# Altium footprint library Cty1.PcbLib: 869 footprints (part 35 of 55)
Each footprint in its own frame and in the unit in brackets; x right, y up, seen from the top. Pads: shape width x height; smd on the part's side, far side on the other; paste and mask are expansions set on the pad; w line width, h text height; cw(c..) or ccw(c..) is an arc to the next point about the centre after c.
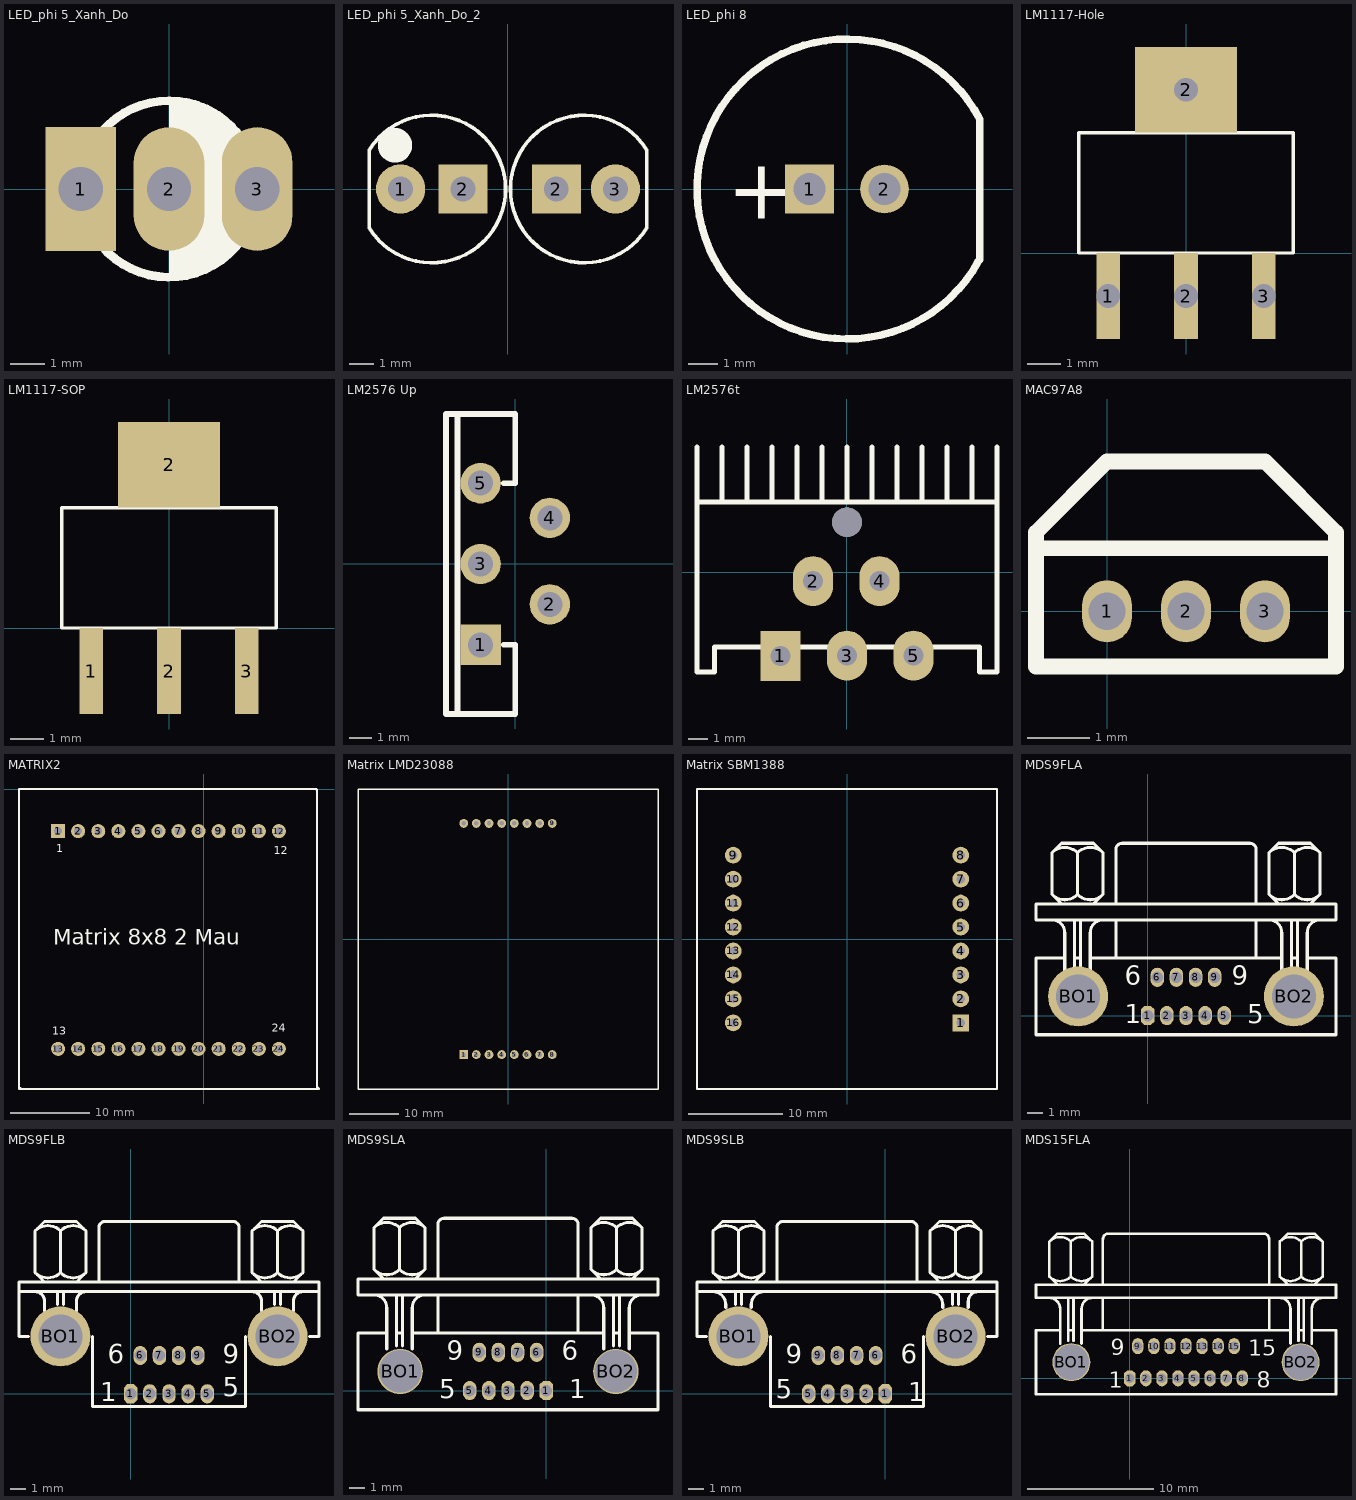
[diagram p34: the footprints below, top view; thin cyan lines are the x and y axes]

## LED_phi 5_Xanh_Do [mil] "LED phi 5mm 2 mau xanh va do"
height 314.96
pads (3):
  rect 80x140 hole 50: 1(-100,0)
  oval 80x140 hole 50: 2(0,0) 3(100,0)
Top Overlay:
  region: 0,100 0,-100 25,-100 35,-90 50,-90 87.62,-52.38 87.62,45.71 88.49,46.58 88.49,51.51 70.71,69.29 70.71,70.71 69.29,70.71 47,93 7,93
  region: 0,100 7,93 27,93
  lines w10: 0,100 cw(c0,0) 70.71,70.71 ; 87.62,-48.19 cw(c0,0) 88.49,46.58 88.49,-47.32

## LED_phi 5_Xanh_Do_2 [mm] "LED phi 5mm 2 mau xanh va do doc lap"
height 8
pads (4):
  round 2 hole 1: 1(-4.37,0) 3(4.37,0)
  rect 2x2 hole 1: 2(-1.83,0) 2(1.97,0)
Top Overlay:
  circle w1: c-4.594,1.778 r0.2
  lines w0.15: -5.64,-1.6 -5.64,1.575 ; -5.638,-1.599 ccw(c-3.1,0) -5.638,1.599 ; 5.638,-1.575 5.638,1.6 ; 5.638,-1.599 cw(c3.1,0) 5.638,1.599

## LED_phi 8 [mil] "LED phi 8mm"
height 649.61
pads (2):
  rect 65x65 hole 43.31: 1(-50,0)
  round 65 hole 43.31: 2(50,0)
Top Overlay:
  lines w10: 175.24,-96.38 cw(c0,0) 176.98,93.15 176.98,-94.64
  text "+" at -160,-40 h80

## LM1117-Hole [mm]
pads (4):
  rect 0.7x2.54 hole 0.7: 1(-2.3,-1.27) 2(0,-1.27) 3(2.3,-1.27)
  rect 3x2.54 hole 0.7: 2(0,4.826)
Top Overlay:
  lines w0.1: -3.175,0 -3.175,3.556 3.175,3.556 3.175,0 -3.175,0
3D body "SW3DPS-SOT-223-DEFAULT.step": height 1.68, standoff 0, extent -3.25,-1.702 3.25,5.258

## LM1117-SOP [mm]
pads (4):
  rect 0.7x2.54 smd: 1(-2.3,-1.27) 2(0,-1.27) 3(2.3,-1.27)
  rect 3x2.54 smd: 2(0,4.826)
Top Overlay:
  lines w0.1: -3.175,0 -3.175,3.556 3.175,3.556 3.175,0 -3.175,0
3D body "SW3DPS-SOT-223-DEFAULT.step": height 1.68, standoff 0, extent -3.25,-1.778 3.25,5.182

## LM2576 Up [mil] "IC nguon LM2576"
pads (5):
  rect 70x70 hole 43.31: 1(-60,-140)
  round 70 hole 43.31: 2(60,-70) 3(-60,0) 4(60,80) 5(-60,140)
Top Overlay:
  lines w10: -100,-260 -100,260 ; -20,-140 0,-140 0,-260 -120,-260 -120,260 0,260 0,140 -20,140

## LM2576t [mil]
pads (6):
  rect 80x100 hole 40: 1(-132,-167.09)
  oval 80x100 hole 40: 2(-67,-18) 3(1,-167) 4(66,-18) 5(134,-167)
  round 59.06 hole 59.06: ""(1,100)
Top Overlay:
  lines w10: -299,140 301,140 ; -299,250 -299,-200 -264,-200 -264,-150 266,-150 266,-200 301,-200 301,250 ; -249,140 -249,250 ; -199,140 -199,250 ; -149,140 -149,250 ; -99,140 -99,250 ; -49,140 -49,250 ; 1,140 1,250 ; 51,140 51,250 ; 101,140 101,250 ; 151,140 151,250 ; 201,140 201,250 ; 251,140 251,250
3D body "SW3dPS-TO220-5.STEP": height 859.05, standoff -85.43, extent -199,-174.91 201,149.5

## MAC97A8 [mm]
pads (3):
  oval 0.8x1 hole 0.6: 1(0,0) 2(1.27,0) 3(2.54,0)
Top Overlay:
  lines w0.254: -1.143,1.016 -1.143,-0.889 3.683,-0.889 3.683,1.016 ; -1.143,1.016 -1.143,1.27 0,2.413 2.54,2.413 3.683,1.27 3.683,1.016 ; -1.143,1.016 3.683,1.016

## MATRIX2 [mil]
pads (24):
  rect 70x70 hole 39.37: 1(-725,-210)
  round 70 hole 39.37: 2(-625,-210) 3(-525,-210) 4(-425,-210) 5(-325,-210) 6(-225,-210) 7(-125,-210) 8(-25,-210) 9(75,-210) 10(175,-210) 11(275,-210) 12(375,-210) 13(-725,-1295) 14(-625,-1295) 15(-525,-1295) 16(-425,-1295) 17(-325,-1295) 18(-225,-1295) 19(-125,-1295) 20(-25,-1295) 21(75,-1295) 22(175,-1295) 23(275,-1295) 24(375,-1295)
Top Overlay:
  lines w10: 555,0 -920,0 -920,-1495 -915,-1490 -910,-1495 575,-1495 565,-1485 565,-5 560,0
  text "Matrix 8x8 2 Mau" at -750,-775 h78.74
  text "1" at -735,-315 h39.37
  text "12" at 350,-325 h39.37
  text "13" at -755,-1225 h39.37
  text "24" at 340,-1210 h39.37

## Matrix LMD23088 [mil] "Matrix 8x8"
pads (16):
  rect 70x70 hole 35: 1(-350,-913.39)
  round 70 hole 35: 2(-250,-913.39) 3(-150,-913.39) 4(-50,-913.39) 5(50,-913.39) 6(150,-913.39) 7(250,-913.39) 8(350,-913.39) 9(350,913.39) 10(250,913.39) 11(150,913.39) 12(50,913.39) 13(-50,913.39) 14(-150,913.39) 15(-250,913.39) 16(-350,913.39)
Top Overlay:
  lines w10: -1185.04,-1185.04 1185.04,-1185.04 1185.04,1185.04 -1185.04,1185.04 -1185.04,-1185.04

## Matrix SBM1388 [mil] "Matrix 8x8"
pads (16):
  rect 70x70 hole 35: 1(475,-350)
  round 70 hole 35: 2(475,-250) 3(475,-150) 4(475,-50) 5(475,50) 6(475,150) 7(475,250) 8(475,350) 9(-475,350) 10(-475,250) 11(-475,150) 12(-475,50) 13(-475,-50) 14(-475,-150) 15(-475,-250) 16(-475,-350)
Top Overlay:
  lines w10: -625.98,-625.98 625.98,-625.98 625.98,625.98 -625.98,625.98 -625.98,-625.98

## MDS9FLA [mil]
pads (11):
  oct 35x50 hole 30: 1(0,0)
  oval 35x50 hole 30: 2(50,0) 3(100,0) 4(150,0) 5(200,0) 6(25,100) 7(75,100) 8(125,100) 9(175,100)
  round 156.67 hole 115: BO1(-181.67,50) BO2(381.67,50)
Top Overlay:
  lines w8: -250.25,316.41 ccw(c-216.67,350) -183.08,316.41 ; -250.25,425.25 cw(c-216.67,391.67) -183.08,425.25 ; -250,250 cw(c-250,216.67) -216.67,216.67 -216.67,108.33 ; -225,291.67 -250,316.67 -250,425 -225,450 -141.67,450 -116.67,425 -116.67,316.67 -141.67,291.67 ; -216.67,150 -291.67,150 -291.67,-50 491.67,-50 491.67,150 416.67,150 ; -191.67,116.67 -191.67,250 ; -191.67,150 -175,150 ; -183.59,316.41 ccw(c-150,350) -116.41,316.41 ; -183.59,425.25 cw(c-150,391.67) -116.41,425.25 ; -183.33,316.67 -183.33,425 ; -175,116.67 -175,250 ; -150,108.33 -150,216.67 cw(c-116.67,216.67) -116.67,250 ; -150,150 350,150 ; -83.33,150 -83.33,250 ; -83.33,291.67 -83.33,433.33 cw(c-66.67,433.33) -66.67,450 266.67,450 cw(c266.67,433.33) 283.33,433.33 283.33,291.67 275,291.67 ; 283.33,150 283.33,250 ; 316.41,316.41 ccw(c350,350) 383.59,316.41 ; 316.41,425.25 cw(c350,391.67) 383.59,425.25 ; 316.67,250 cw(c316.67,216.67) 350,216.67 350,108.33 ; 341.67,291.67 316.67,316.67 316.67,425 341.67,450 425,450 450,425 450,316.67 425,291.67 ; 375,116.67 375,250 ; 375,150 391.67,150 ; 383.08,316.41 ccw(c416.67,350) 450.25,316.41 ; 383.08,425.25 cw(c416.67,391.67) 450.25,425.25 ; 383.33,316.67 383.33,425 ; 391.67,116.67 391.67,250 ; 416.67,108.33 416.67,216.67 cw(c450,216.67) 450,250 ; -291.67,250 491.67,250 491.67,291.67 -291.67,291.67 -291.67,250
  text "1" at -60,-20 h50
  text "9" at 220,80 h50
  text "5" at 260,-20 h50
  text "6" at -60,80 h50

## MDS9FLB [mil]
pads (11):
  oct 35x50 hole 30: 1(0,0)
  oval 35x50 hole 30: 2(50,0) 3(100,0) 4(150,0) 5(200,0) 6(25,100) 7(75,100) 8(125,100) 9(175,100)
  round 156.67 hole 115: BO1(-183.33,150) BO2(383.33,150)
Top Overlay:
  lines w8: -266.67,150 -291.67,150 -291.67,266.67 ; -250.25,316.41 ccw(c-216.67,350) -183.08,316.41 ; -250.25,425.25 cw(c-216.67,391.67) -183.08,425.25 ; -250,266.67 cw(c-250,241.67) -225,241.67 -225,216.67 ; -225,291.67 -250,316.67 -250,425 -225,450 -141.67,450 -116.67,425 -116.67,316.67 -141.67,291.67 ; -191.67,233.33 -191.67,266.67 ; -183.59,316.41 ccw(c-150,350) -116.41,316.41 ; -183.59,425.25 cw(c-150,391.67) -116.41,425.25 ; -183.33,316.67 -183.33,425 ; -175,233.33 -175,266.67 ; -141.67,216.67 -141.67,241.67 cw(c-116.67,241.67) -116.67,266.67 ; -100,150 -100,-33.33 300,-33.33 300,150 ; -83.33,291.67 -83.33,433.33 cw(c-66.67,433.33) -66.67,450 266.67,450 cw(c266.67,433.33) 283.33,433.33 283.33,291.67 275,291.67 ; 316.41,316.41 ccw(c350,350) 383.59,316.41 ; 316.41,425.25 cw(c350,391.67) 383.59,425.25 ; 316.67,266.67 cw(c316.67,241.67) 341.67,241.67 341.67,216.67 ; 341.67,291.67 316.67,316.67 316.67,425 341.67,450 425,450 450,425 450,316.67 425,291.67 ; 375,233.33 375,266.67 ; 383.08,316.41 ccw(c416.67,350) 450.25,316.41 ; 383.08,425.25 cw(c416.67,391.67) 450.25,425.25 ; 383.33,316.67 383.33,425 ; 391.67,233.33 391.67,266.67 ; 425,216.67 425,241.67 cw(c450,241.67) 450,266.67 ; 466.67,150 491.67,150 491.67,266.67 ; -291.67,266.67 -291.67,291.67 491.67,291.67 491.67,266.67 ; -291.67,266.67 491.67,266.67
  text "9" at 240,80 h50
  text "6" at -60,80 h50
  text "1" at -80,-20 h50
  text "5" at 240.94,-6.59 h50

## MDS9SLA [mil]
pads (11):
  oct 35x50 hole 30: 1(0,0)
  oval 35x50 hole 30: 2(-50,0) 3(-100,0) 4(-150,0) 5(-200,0) 6(-25,100) 7(-75,100) 8(-125,100) 9(-175,100)
  round 118.33 hole 110.83: BO1(-381.67,50) BO2(181.67,50)
Top Overlay:
  lines w8: -450.25,316.41 ccw(c-416.67,350) -383.08,316.41 ; -450.25,425.25 cw(c-416.67,391.67) -383.08,425.25 ; -450,250 cw(c-450,216.67) -416.67,216.67 -416.67,108.33 ; -425,291.67 -450,316.67 -450,425 -425,450 -341.67,450 -316.67,425 -316.67,316.67 -341.67,291.67 ; -416.67,150 -491.67,150 -491.67,-50 291.67,-50 291.67,150 216.67,150 ; -391.67,116.67 -391.67,250 ; -391.67,150 -375,150 ; -383.59,316.41 ccw(c-350,350) -316.41,316.41 ; -383.59,425.25 cw(c-350,391.67) -316.41,425.25 ; -383.33,316.67 -383.33,425 ; -375,116.67 -375,250 ; -350,108.33 -350,216.67 cw(c-316.67,216.67) -316.67,250 ; -350,150 150,150 ; -283.33,150 -283.33,250 ; -283.33,291.67 -283.33,433.33 cw(c-266.67,433.33) -266.67,450 66.67,450 cw(c66.67,433.33) 83.33,433.33 83.33,291.67 75,291.67 ; 83.33,150 83.33,250 ; 116.41,316.41 ccw(c150,350) 183.59,316.41 ; 116.41,425.25 cw(c150,391.67) 183.59,425.25 ; 116.67,250 cw(c116.67,216.67) 150,216.67 150,108.33 ; 141.67,291.67 116.67,316.67 116.67,425 141.67,450 225,450 250,425 250,316.67 225,291.67 ; 175,116.67 175,250 ; 175,150 191.67,150 ; 183.08,316.41 ccw(c216.67,350) 250.25,316.41 ; 183.08,425.25 cw(c216.67,391.67) 250.25,425.25 ; 183.33,316.67 183.33,425 ; 191.67,116.67 191.67,250 ; 216.67,108.33 216.67,216.67 cw(c250,216.67) 250,250 ; -491.67,250 291.67,250 291.67,291.67 -491.67,291.67 -491.67,250
  text "6" at 40,80 h50
  text "9" at -260,80 h50
  text "5" at -280,-20 h50
  text "1" at 60,-20 h50

## MDS9SLB [mil]
pads (11):
  oct 35x50 hole 30: 1(0,0)
  oval 35x50 hole 30: 2(-50,0) 3(-100,0) 4(-150,0) 5(-200,0) 6(-25,100) 7(-75,100) 8(-125,100) 9(-175,100)
  round 156.67 hole 115: BO1(-383.33,150) BO2(183.33,150)
Top Overlay:
  lines w8: -466.67,150 -491.67,150 -491.67,266.67 ; -450.25,316.41 ccw(c-416.67,350) -383.08,316.41 ; -450.25,425.25 cw(c-416.67,391.67) -383.08,425.25 ; -450,266.67 cw(c-450,233.33) -416.67,233.33 -416.67,225 ; -425,291.67 -450,316.67 -450,425 -425,450 -341.67,450 -316.67,425 -316.67,316.67 -341.67,291.67 ; -391.67,233.33 -391.67,266.67 ; -383.59,316.41 ccw(c-350,350) -316.41,316.41 ; -383.59,425.25 cw(c-350,391.67) -316.41,425.25 ; -383.33,316.67 -383.33,425 ; -375,233.33 -375,266.67 ; -350,225 -350,233.33 cw(c-316.67,233.33) -316.67,266.67 ; -300,150 -300,-33.33 100,-33.33 100,150 ; -283.33,291.67 -283.33,433.33 cw(c-266.67,433.33) -266.67,450 66.67,450 cw(c66.67,433.33) 83.33,433.33 83.33,291.67 75,291.67 ; 116.41,316.41 ccw(c150,350) 183.59,316.41 ; 116.41,425.25 cw(c150,391.67) 183.59,425.25 ; 116.67,266.67 cw(c116.67,233.33) 150,233.33 150,225 ; 141.67,291.67 116.67,316.67 116.67,425 141.67,450 225,450 250,425 250,316.67 225,291.67 ; 175,233.33 175,266.67 ; 183.08,316.41 ccw(c216.67,350) 250.25,316.41 ; 183.08,425.25 cw(c216.67,391.67) 250.25,425.25 ; 183.33,316.67 183.33,425 ; 191.67,233.33 191.67,266.67 ; 216.67,225 216.67,241.67 cw(c241.67,241.67) 241.67,266.67 ; 266.67,150 291.67,150 291.67,266.67 ; -491.67,266.67 291.67,266.67 ; -491.67,266.67 -491.67,291.67 291.67,291.67 291.67,266.67
  text "6" at 40,80 h50
  text "9" at -260,80 h50
  text "1" at 60,-20 h50
  text "5" at -286.05,-11.4 h50

## MDS15FLA [mil]
pads (17):
  oct 35x50 hole 30: 1(0,0)
  oval 35x50 hole 30: 2(50,0) 3(100,0) 4(150,0) 5(200,0) 6(250,0) 7(300,0) 8(350,0) 9(25,100) 10(75,100) 11(125,100) 12(175,100) 13(225,100) 14(275,100) 15(325,100)
  round 118.33 hole 110.83: BO1(-181.67,50) BO2(531.67,50)
Top Overlay:
  lines w8: -250.25,316.41 ccw(c-216.67,350) -183.08,316.41 ; -250.25,425.25 cw(c-216.67,391.67) -183.08,425.25 ; -250,250 cw(c-250,216.67) -216.67,216.67 -216.67,108.33 ; -225,291.67 -250,316.67 -250,425 -225,450 -141.67,450 -116.67,425 -116.67,316.67 -141.67,291.67 ; -216.67,150 -291.67,150 -291.67,-50 641.67,-50 641.67,150 566.67,150 ; -191.67,116.67 -191.67,250 ; -191.67,150 -175,150 ; -183.59,316.41 ccw(c-150,350) -116.41,316.41 ; -183.59,425.25 cw(c-150,391.67) -116.41,425.25 ; -183.33,316.67 -183.33,425 ; -175,116.67 -175,250 ; -150,108.33 -150,216.67 cw(c-116.67,216.67) -116.67,250 ; -150,150 500,150 ; -83.33,150 -83.33,250 ; -83.33,291.67 -83.33,433.33 cw(c-66.67,433.33) -66.67,450 416.67,450 cw(c416.67,433.33) 433.33,433.33 433.33,291.67 425,291.67 ; 433.33,150 433.33,250 ; 466.41,316.41 ccw(c500,350) 533.59,316.41 ; 466.41,425.25 cw(c500,391.67) 533.59,425.25 ; 466.67,250 cw(c466.67,216.67) 500,216.67 500,108.33 ; 491.67,291.67 466.67,316.67 466.67,425 491.67,450 575,450 600,425 600,316.67 575,291.67 ; 525,116.67 525,250 ; 525,150 541.67,150 ; 533.08,316.41 ccw(c566.67,350) 600.25,316.41 ; 533.08,425.25 cw(c566.67,391.67) 600.25,425.25 ; 533.33,316.67 533.33,425 ; 541.67,116.67 541.67,250 ; 566.67,108.33 566.67,216.67 cw(c600,216.67) 600,250 ; -291.67,250 641.67,250 641.67,291.67 -291.67,291.67 -291.67,250
  text "15" at 368.7,69.7 h50
  text "8" at 395,-30 h50
  text "1" at -65,-30 h50
  text "9" at -58.7,72 h50